# Altium footprint library ref-packages.PCBLIB: 1543 footprints (part 30 of 103)
Each footprint in its own frame and in the unit in brackets; x right, y up, seen from the top. Pads: shape width x height; smd on the part's side, far side on the other; paste and mask are expansions set on the pad; w line width, h text height; cw(c..) or ccw(c..) is an arc to the next point about the centre after c.
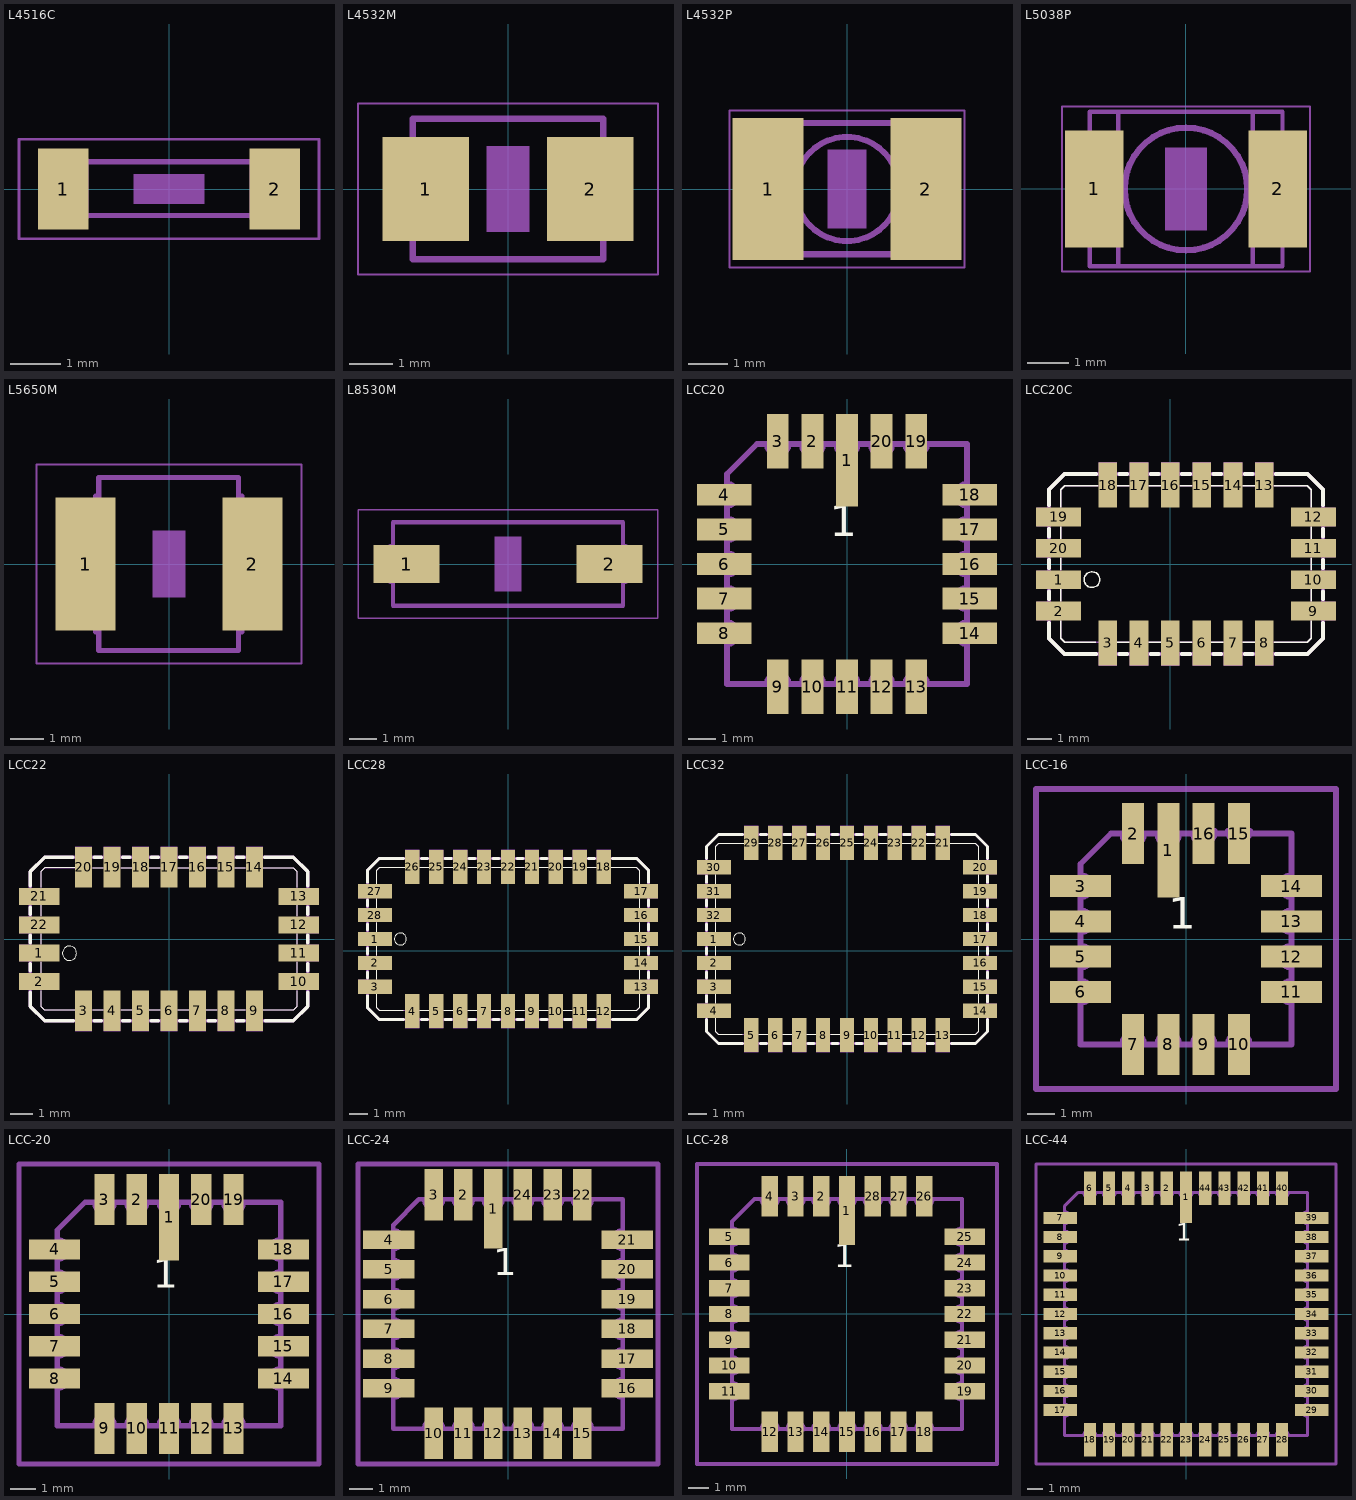
[diagram p29: the footprints below, top view; thin cyan lines are the x and y axes]

## L4516C [mm]
pads (2):
  rect 1x1.6 smd: 1(-2.1,0) 2(2.1,0)
Mechanical 6:
  rectangle: -0.7,-0.3 0.7,0.3
Mechanical 16:
  rectangle: -2.4,-0.597 -1.6,0.603
  rectangle: 1.6,-0.603 2.4,0.597
  lines w0.102: -1.626,-0.527 1.626,-0.527 ; -1.626,0.54 1.626,0.54
Mechanical 27:
  lines w0.051: -2.973,-0.983 2.973,-0.983 2.973,0.983 -2.973,0.983 -2.973,-0.983

## L4532M [mm]
pads (2):
  rect 2x2.4 smd: 1(-1.9,0) 2(1.9,0)
Mechanical 6:
  rectangle: -0.5,-1 0.5,1
Mechanical 16:
  lines w0.152: -2.337,-1.041 -2.337,1.041 ; 2.337,-1.041 2.337,1.041 ; -2.21,-1.626 2.21,-1.626 2.21,1.626 -2.21,1.626 -2.21,-1.626
Mechanical 27:
  lines w0.051: -3.473,-1.983 3.473,-1.983 3.473,1.983 -3.473,1.983 -3.473,-1.983

## L4532P [mm]
pads (2):
  rect 1.8x3.6 smd: 1(-2,0) 2(2,0)
Mechanical 6:
  rectangle: -0.5,-1 0.5,1
Mechanical 16:
  circle w0.152: c0,0 r1.321
  lines w0.152: -2.311,-1.653 2.311,-1.653 ; -2.311,-1.626 -2.311,1.626 ; -2.311,1.675 2.311,1.675 2.311,-1.626 ; -1.448,-1.626 -1.448,1.651 ; 1.448,-1.626 1.448,1.626
Mechanical 27:
  lines w0.051: -2.973,-1.983 2.973,-1.983 2.973,1.983 -2.973,1.983 -2.973,-1.983

## L5038P [mil]
pads (2):
  rect 55.12x110.24 smd: 1(-86.61,0) 2(86.61,0)
Mechanical 6:
  rectangle: -19.69,-39.37 19.69,39.37
Mechanical 16:
  circle w6: c0,0 r58
  lines w4: -93.94,-50 -93.94,50 ; -90.94,-72.99 -90.94,72.99 ; -90,-73.07 90.98,-73.07 ; -90,72.95 90.98,72.95 ; -63.94,-72.99 -63.94,72.99 ; 63.07,-72.99 63.07,72.99 ; 91.06,-72.99 91.06,72.99 ; 94.06,-50 94.06,50
Mechanical 27:
  lines w2: -117.05,-78.07 117.05,-78.07 117.05,78.07 -117.05,78.07 -117.05,-78.07

## L5650M [mm]
pads (2):
  rect 1.8x4 smd: 1(-2.5,0) 2(2.5,0)
Mechanical 6:
  rectangle: -0.5,-1 0.5,1
Mechanical 16:
  lines w0.152: -2.21,-2.032 -2.21,2.032 ; 2.184,-2.032 2.184,2.032 ; -2.108,-2.591 2.083,-2.591 2.083,2.591 -2.108,2.591 -2.108,-2.591
Mechanical 27:
  lines w0.051: -3.973,-2.983 3.973,-2.983 3.973,2.983 -3.973,2.983 -3.973,-2.983

## L8530M [mm]
pads (2):
  rect 2.4x1.4 smd: 1(-3.7,0) 2(3.7,0)
Mechanical 6:
  rectangle: -0.5,-1 0.5,1
Mechanical 16:
  lines w0.152: -4.293,-0.66 -4.293,0.66 ; 4.293,-0.66 4.293,0.66 ; -4.191,-1.524 -4.191,1.524 4.191,1.524 4.191,-1.524 -4.191,-1.524
Mechanical 27:
  lines w0.051: -5.473,-1.983 5.473,-1.983 5.473,1.983 -5.473,1.983 -5.473,-1.983

## LCC20 [mil]
pads (20):
  rect 31.5x133.86 smd: 1(0,149.61)
  rect 31.5x78.74 smd: 2(-50,177.17) 3(-100,177.17) 9(-100,-177.17) 10(-50,-177.17) 11(0,-177.17) 12(50,-177.17) 13(100,-177.17) 19(100,177.17) 20(50,177.17)
  rect 78.74x31.5 smd: 4(-177.17,100) 5(-177.17,50) 6(-177.17,0) 7(-177.17,-50) 8(-177.17,-100) 14(177.17,-100) 15(177.17,-50) 16(177.17,0) 17(177.17,50) 18(177.17,100)
Top Overlay:
  text "1" at -25,25 h77.5
Mechanical 16:
  lines w8: -173.23,-173.62 -173.23,-173.23 ; -173.23,-115.75 -173.23,-173.23 ; -173.23,-84.25 -173.23,-65.75 ; -173.23,-34.25 -173.23,-15.75 ; -173.23,15.75 -173.23,34.25 ; -173.23,65.75 -173.23,84.25 ; -173.23,115.75 -173.23,129.92 -129.92,173.23 -115.75,173.23 ; -173.17,-115.75 ccw(c-173.17,-100) -173.17,-84.25 ; -173.17,-65.75 ccw(c-173.17,-50) -173.17,-34.25 ; -173.17,-15.75 ccw(c-173.17,0) -173.17,15.75 ; -173.17,34.25 ccw(c-173.17,50) -173.17,65.75 ; -173.17,84.25 ccw(c-173.17,100) -173.17,115.75 ; -115.75,-173.23 -173.23,-173.23 ; -115.75,-173.17 cw(c-100,-173.17) -84.25,-173.17 ; -115.75,173.17 ccw(c-100,173.17) -84.25,173.17 ; -84.25,-173.23 -65.75,-173.23 ; -84.25,173.23 -65.75,173.23 ; -65.75,-173.17 cw(c-50,-173.17) -34.25,-173.17 ; -65.75,173.17 ccw(c-50,173.17) -34.25,173.17 ; -34.25,-173.23 -15.75,-173.23 ; -34.25,173.23 -15.75,173.23 ; -15.75,-173.17 cw(c0,-173.17) 15.75,-173.17 ; -15.75,173.17 ccw(c0,173.17) 15.75,173.17 ; 15.75,-173.23 34.25,-173.23 ; 15.75,173.23 34.25,173.23 ; 34.25,-173.17 cw(c50,-173.17) 65.75,-173.17 ; 34.25,173.17 ccw(c50,173.17) 65.75,173.17 ; 65.75,-173.23 84.25,-173.23 ; 65.75,173.23 84.25,173.23 ; 84.25,-173.17 cw(c100,-173.17) 115.75,-173.17 ; 84.25,173.17 ccw(c100,173.17) 115.75,173.17 ; 115.75,-173.23 173.23,-173.23 173.23,-115.75 ; 115.75,173.23 173.23,173.23 173.23,115.75 ; 173.17,-115.75 cw(c173.17,-100) 173.17,-84.25 ; 173.17,-65.75 cw(c173.17,-50) 173.17,-34.25 ; 173.17,-15.75 cw(c173.17,0) 173.17,15.75 ; 173.17,34.25 cw(c173.17,50) 173.17,65.75 ; 173.17,84.25 cw(c173.17,100) 173.17,115.75 ; 173.23,-84.25 173.23,-65.75 ; 173.23,-34.25 173.23,-15.75 ; 173.23,15.75 173.23,34.25 ; 173.23,65.75 173.23,84.25

## LCC20C [mil]
pads (20):
  rect 72.01x30 smd: 1(-178.35,-25) 2(-178.35,-75) 9(228.35,-75) 10(228.35,-25) 11(228.35,25) 12(228.35,75) 19(-178.35,75) 20(-178.35,25)
  rect 30x72.01 smd: 3(-100,-125.98) 4(-50,-125.98) 5(0,-125.98) 6(50,-125.98) 7(100,-125.98) 8(150,-125.98) 13(150,125.98) 14(100,125.98) 15(50,125.98) 16(0,125.98) 17(-50,125.98) 18(-100,125.98)
Top Overlay:
  circle w2: c-125,-25 r12.5
  lines w2: -175,-90.63 -175,-118.74 -168.74,-125 -118.74,-125 ; -175,-59.37 -175,-40.63 ; -175,-9.37 -175,9.37 ; -175,40.63 -175,59.37 ; -175,90.63 -175,118.74 -168.74,125 -115.63,125 ; -84.37,-125 -65.63,-125 ; -84.37,125 -65.63,125 ; -34.37,-125 -15.63,-125 ; -34.37,125 -15.63,125 ; 15.63,-125 34.37,-125 ; 15.63,125 34.37,125 ; 65.63,-125 84.37,-125 ; 65.63,125 84.37,125 ; 115.63,-125 134.37,-125 ; 115.63,125 134.37,125 ; 165.63,-125 218.74,-125 225,-118.74 225,-90.63 ; 165.63,125 218.74,125 225,118.74 225,90.63 ; 225,-59.37 225,-40.63 ; 225,-9.37 225,9.37 ; 225,40.63 225,59.37
  lines w6: -193.74,-93.74 -193.74,-118.74 -168.74,-143.74 -118.74,-143.74 ; -193.74,-56.26 -193.74,-43.74 ; -193.74,-6.26 -193.75,6.25 ; -193.75,43.75 -193.75,56.25 ; -193.75,93.75 -193.75,118.75 -168.75,143.75 -118.75,143.75 ; -81.26,-143.74 -68.74,-143.74 ; -81.25,143.75 -68.75,143.75 ; -31.26,-143.74 -18.74,-143.74 ; -31.25,143.75 -18.75,143.75 ; 18.75,-143.75 31.25,-143.75 ; 18.74,143.74 31.26,143.74 ; 68.75,-143.75 81.25,-143.75 ; 68.74,143.74 81.26,143.74 ; 118.75,-143.75 131.25,-143.75 ; 118.74,143.74 131.26,143.74 ; 168.75,-143.75 218.75,-143.75 243.75,-118.75 243.75,-93.75 ; 168.74,143.74 218.74,143.74 243.74,118.74 243.74,93.74 ; 243.75,-56.25 243.75,-43.75 ; 243.75,-6.25 243.74,6.26 ; 243.74,43.74 243.74,56.26
Mechanical 16:
  rectangle: -114.96,144.88 -85.04,162.6
  rectangle: -64.96,144.88 -35.04,162.6
  rectangle: -14.96,144.88 14.96,162.6
  rectangle: 35.04,144.88 64.96,162.6
  rectangle: 85.04,144.88 114.96,162.6
  rectangle: -114.96,-162.6 -85.04,-144.88
  rectangle: -64.96,-162.6 -35.04,-144.88
  rectangle: -14.96,-162.6 14.96,-144.88
  rectangle: 35.04,-162.6 64.96,-144.88
  rectangle: 85.04,-162.6 114.96,-144.88
  rectangle: 246.06,60.04 263.78,89.96
  rectangle: 246.06,10.04 263.78,39.96
  rectangle: 246.06,-39.96 263.78,-10.04
  rectangle: 246.06,-89.96 263.78,-60.04
  rectangle: -213.78,60.04 -196.06,89.96
  rectangle: -213.78,10.04 -196.06,39.96
  rectangle: -213.78,-39.96 -196.06,-10.04
  rectangle: -213.78,-89.96 -196.06,-60.04
  rectangle: 135.04,144.88 164.96,162.6
  rectangle: 135.04,-162.6 164.96,-144.88
  lines w2: -175,-118.74 -168.74,-125 218.74,-125 225,-118.74 225,118.74 218.74,125 -168.74,125 -175,118.74 -175,-118.74
  lines w6: 37.4,144.88 62.6,144.88 ; 87.4,144.88 112.6,144.88 ; 137.4,144.88 162.6,144.88 ; -193.74,-118.74 -168.74,-143.74 218.75,-143.75 243.75,-118.75 243.74,118.74 218.74,143.74 -168.75,143.75 -193.75,118.75 -193.74,-118.74

## LCC22 [mil]
pads (22):
  rect 70.87x29.92 smd: 1(-228.35,-25) 2(-228.35,-75) 10(228.35,-75) 11(228.35,-25) 12(228.35,25) 13(228.35,75) 21(-228.35,75) 22(-228.35,25)
  rect 29.92x70.87 smd: 3(-150,-125.98) 4(-100,-125.98) 5(-50,-125.98) 6(0,-125.98) 7(50,-125.98) 8(100,-125.98) 9(150,-125.98) 14(150,125.98) 15(100,125.98) 16(50,125.98) 17(0,125.98) 18(-50,125.98) 19(-100,125.98) 20(-150,125.98)
Top Overlay:
  circle w2: c-175,-25 r12.5
  lines w2: -225,-90.63 -225,-118.74 -218.74,-125 -165.63,-125 ; -225,-59.37 -225,-40.63 ; -225,-9.37 -225,9.37 ; -225,40.63 -225,59.37 ; -225,90.63 -225,118.74 -218.74,125 -165.63,125 ; -134.37,-125 -115.63,-125 ; -134.37,125 -115.63,125 ; -84.37,-125 -65.63,-125 ; -84.37,125 -65.63,125 ; -34.37,-125 -15.63,-125 ; -34.37,125 -15.63,125 ; 15.63,-125 34.37,-125 ; 15.63,125 34.37,125 ; 65.63,-125 84.37,-125 ; 65.63,125 84.37,125 ; 115.63,-125 134.37,-125 ; 115.63,125 134.37,125 ; 165.63,-125 218.74,-125 225,-118.74 225,-90.63 ; 165.63,125 218.74,125 225,118.74 225,90.63 ; 225,-59.37 225,-40.63 ; 225,-9.37 225,9.37 ; 225,40.63 225,59.37
  lines w6: -243.74,-93.74 -243.74,-118.74 -218.74,-143.74 -168.74,-143.74 ; -243.74,-56.26 -243.74,-43.74 ; -243.74,-6.26 -243.75,6.25 ; -243.75,43.75 -243.75,56.25 ; -243.75,93.75 -243.75,118.75 -218.75,143.75 -168.75,143.75 ; -131.26,-143.74 -118.74,-143.74 ; -131.25,143.75 -118.75,143.75 ; -81.26,-143.74 -68.74,-143.74 ; -81.25,143.75 -68.75,143.75 ; -31.26,-143.74 -18.74,-143.74 ; -31.25,143.75 -18.75,143.75 ; 18.75,-143.75 31.25,-143.75 ; 18.74,143.74 31.26,143.74 ; 68.75,-143.75 81.25,-143.75 ; 68.74,143.74 81.26,143.74 ; 118.75,-143.75 131.25,-143.75 ; 118.74,143.74 131.26,143.74 ; 168.75,-143.75 218.75,-143.75 243.75,-118.75 243.75,-93.75 ; 168.74,143.74 218.74,143.74 243.74,118.74 243.74,93.74 ; 243.75,-56.25 243.75,-43.75 ; 243.75,-6.25 243.74,6.26 ; 243.74,43.74 243.74,56.26
Mechanical 16:
  rectangle: -114.96,144.88 -85.04,162.6
  rectangle: -64.96,144.88 -35.04,162.6
  rectangle: -14.96,144.88 14.96,162.6
  rectangle: 35.04,144.88 64.96,162.6
  rectangle: 85.04,144.88 114.96,162.6
  rectangle: -114.96,-162.6 -85.04,-144.88
  rectangle: -64.96,-162.6 -35.04,-144.88
  rectangle: -14.96,-162.6 14.96,-144.88
  rectangle: 35.04,-162.6 64.96,-144.88
  rectangle: 85.04,-162.6 114.96,-144.88
  rectangle: 246.06,60.04 263.78,89.96
  rectangle: 246.06,10.04 263.78,39.96
  rectangle: 246.06,-39.96 263.78,-10.04
  rectangle: 246.06,-89.96 263.78,-60.04
  rectangle: -263.78,60.04 -246.06,89.96
  rectangle: -263.78,10.04 -246.06,39.96
  rectangle: -263.78,-39.96 -246.06,-10.04
  rectangle: -263.78,-89.96 -246.06,-60.04
  rectangle: 135.04,144.88 164.96,162.6
  rectangle: 135.04,-162.6 164.96,-144.88
  rectangle: -164.96,144.88 -135.04,162.6
  rectangle: -164.96,-162.6 -135.04,-144.88
  lines w2: -225,-118.74 -218.74,-125 218.74,-125 225,-118.74 225,118.74 218.74,125 -218.74,125 -225,118.74 -225,-118.74
  lines w6: 37.4,144.88 62.6,144.88 ; 87.4,144.88 112.6,144.88 ; 137.4,144.88 162.6,144.88 ; -243.74,-118.74 -218.74,-143.74 218.75,-143.75 243.75,-118.75 243.74,118.74 218.74,143.74 -218.75,143.75 -243.75,118.75 -243.74,-118.74

## LCC28 [mil]
pads (28):
  rect 70.87x29.92 smd: 1(-278.35,25) 2(-278.35,-25) 3(-278.35,-75) 13(278.35,-75) 14(278.35,-25) 15(278.35,25) 16(278.35,75) 17(278.35,125) 27(-278.35,125) 28(-278.35,75)
  rect 29.92x70.87 smd: 4(-200,-125.98) 5(-150,-125.98) 6(-100,-125.98) 7(-50,-125.98) 8(0,-125.98) 9(50,-125.98) 10(100,-125.98) 11(150,-125.98) 12(200,-125.98) 18(200,175.98) 19(150,175.98) 20(100,175.98) 21(50,175.98) 22(0,175.98) 23(-50,175.98) 24(-100,175.98) 25(-150,175.98) 26(-200,175.98)
Top Overlay:
  circle w2: c-225,25 r12.5
  lines w2: -275,-90.63 -275,-118.74 -268.74,-125 -218.74,-125 ; -275,-59.37 -275,-40.63 ; -275,-9.37 -275,9.37 ; -275,40.63 -275,59.37 ; -275,90.63 -275,109.37 ; -275,140.63 -275,168.74 -268.74,175 -215.63,175 ; -184.37,-125 -165.63,-125 ; -184.37,175 -165.63,175 ; -134.37,-125 -115.63,-125 ; -134.37,175 -115.63,175 ; -84.37,-125 -65.63,-125 ; -84.37,175 -65.63,175 ; -34.37,-125 -15.63,-125 ; -34.37,175 -15.63,175 ; 15.63,-125 34.37,-125 ; 15.63,175 34.37,175 ; 65.63,-125 84.37,-125 ; 65.63,175 84.37,175 ; 115.63,-125 134.37,-125 ; 115.63,175 134.37,175 ; 165.63,-125 184.37,-125 ; 165.63,175 184.37,175 ; 215.63,-125 268.74,-125 275,-118.74 275,-90.63 ; 215.63,175 268.74,175 275,168.74 275,140.63 ; 275,-59.37 275,-40.63 ; 275,-9.37 275,9.37 ; 275,40.63 275,59.37 ; 275,90.63 275,109.37
  lines w6: -293.74,-93.74 -293.74,-118.74 -268.74,-143.74 -218.74,-143.74 ; -293.74,-56.26 -293.74,-43.74 ; -293.74,-6.26 -293.75,6.25 ; -293.74,43.74 -293.75,56.25 ; -293.74,93.74 -293.75,106.25 ; -293.75,143.75 -293.75,168.75 -268.75,193.75 -218.75,193.75 ; -181.26,-143.74 -168.74,-143.74 ; -181.25,193.75 -168.75,193.75 ; -131.26,-143.74 -118.74,-143.74 ; -131.25,193.75 -118.75,193.75 ; -81.26,-143.74 -68.74,-143.74 ; -81.25,193.75 -68.75,193.75 ; -31.26,-143.74 -18.74,-143.74 ; -31.25,193.75 -18.75,193.75 ; 18.75,-143.75 31.25,-143.75 ; 18.74,193.74 31.26,193.74 ; 68.75,-143.75 81.25,-143.75 ; 68.74,193.74 81.26,193.74 ; 118.75,-143.75 131.25,-143.75 ; 118.74,193.74 131.26,193.74 ; 168.75,-143.75 181.25,-143.75 ; 168.74,193.74 181.26,193.74 ; 218.75,-143.75 268.75,-143.75 293.75,-118.75 293.75,-93.75 ; 218.74,193.74 268.74,193.74 293.74,168.74 293.74,143.74 ; 293.75,-56.25 293.75,-43.75 ; 293.75,-6.25 293.74,6.26 ; 293.75,43.75 293.74,56.26 ; 293.75,93.75 293.74,106.26
Mechanical 16:
  rectangle: -114.96,194.88 -85.04,212.6
  rectangle: -64.96,194.88 -35.04,212.6
  rectangle: -14.96,194.88 14.96,212.6
  rectangle: 35.04,194.88 64.96,212.6
  rectangle: 85.04,194.88 114.96,212.6
  rectangle: -114.96,-162.6 -85.04,-144.88
  rectangle: -64.96,-162.6 -35.04,-144.88
  rectangle: -14.96,-162.6 14.96,-144.88
  rectangle: 35.04,-162.6 64.96,-144.88
  rectangle: 85.04,-162.6 114.96,-144.88
  rectangle: 296.06,110.04 313.78,139.96
  rectangle: 296.06,10.04 313.78,39.96
  rectangle: 296.06,-39.96 313.78,-10.04
  rectangle: 296.06,-89.96 313.78,-60.04
  rectangle: -313.78,110.04 -296.06,139.96
  rectangle: -313.78,10.04 -296.06,39.96
  rectangle: -313.78,-39.96 -296.06,-10.04
  rectangle: -313.78,-89.96 -296.06,-60.04
  rectangle: 135.04,194.88 164.96,212.6
  rectangle: 135.04,-162.6 164.96,-144.88
  rectangle: -214.96,194.88 -185.04,212.6
  rectangle: -164.96,194.88 -135.04,212.6
  rectangle: -214.96,-162.6 -185.04,-144.88
  rectangle: -164.96,-162.6 -135.04,-144.88
  rectangle: 296.06,60.04 313.78,89.96
  rectangle: -313.78,60.04 -296.06,89.96
  rectangle: 185.04,194.88 214.96,212.6
  rectangle: 185.04,-162.6 214.96,-144.88
  lines w2: -275,-118.74 -268.74,-125 268.74,-125 275,-118.74 275,168.74 268.74,175 -268.74,175 -275,168.74 -275,-118.74
  lines w6: 37.4,194.88 62.6,194.88 ; 87.4,194.88 112.6,194.88 ; 137.4,194.88 162.6,194.88 ; 187.4,194.88 212.6,194.88 ; -293.74,-118.74 -268.74,-143.74 268.75,-143.75 293.75,-118.75 293.74,168.74 268.74,193.74 -268.75,193.75 -293.75,168.75 -293.74,-118.74

## LCC32 [mil]
pads (32):
  rect 70.87x29.92 smd: 1(-278.35,25) 2(-278.35,-25) 3(-278.35,-75) 4(-278.35,-125) 14(278.35,-125) 15(278.35,-75) 16(278.35,-25) 17(278.35,25) 18(278.35,75) 19(278.35,125) 20(278.35,175) 30(-278.35,175) 31(-278.35,125) 32(-278.35,75)
  rect 29.92x70.87 smd: 5(-200,-175.98) 6(-150,-175.98) 7(-100,-175.98) 8(-50,-175.98) 9(0,-175.98) 10(50,-175.98) 11(100,-175.98) 12(150,-175.98) 13(200,-175.98) 21(200,225.98) 22(150,225.98) 23(100,225.98) 24(50,225.98) 25(0,225.98) 26(-50,225.98) 27(-100,225.98) 28(-150,225.98) 29(-200,225.98)
Top Overlay:
  circle w2: c-225,25 r12.5
  lines w2: -275,-140.63 -275,-168.74 -268.74,-175 -218.74,-175 ; -275,-109.37 -275,-90.63 ; -275,-59.37 -275,-40.63 ; -275,-9.37 -275,9.37 ; -275,40.63 -275,59.37 ; -275,90.63 -275,109.37 ; -275,140.63 -275,159.37 ; -275,190.63 -275,218.74 -268.74,225 -215.63,225 ; -184.37,-175 -165.63,-175 ; -184.37,225 -165.63,225 ; -134.37,-175 -115.63,-175 ; -134.37,225 -115.63,225 ; -84.37,-175 -65.63,-175 ; -84.37,225 -65.63,225 ; -34.37,-175 -15.63,-175 ; -34.37,225 -15.63,225 ; 15.63,-175 34.37,-175 ; 15.63,225 34.37,225 ; 65.63,-175 84.37,-175 ; 65.63,225 84.37,225 ; 115.63,-175 134.37,-175 ; 115.63,225 134.37,225 ; 165.63,-175 184.37,-175 ; 165.63,225 184.37,225 ; 215.63,-175 268.74,-175 275,-168.74 275,-140.63 ; 215.63,225 268.74,225 275,218.74 275,190.63 ; 275,-109.37 275,-90.63 ; 275,-59.37 275,-40.63 ; 275,-9.37 275,9.37 ; 275,40.63 275,59.37 ; 275,90.63 275,109.37 ; 275,140.63 275,159.37
  lines w6: -293.74,-143.74 -293.74,-168.74 -268.74,-193.74 -218.74,-193.74 ; -293.74,-106.26 -293.74,-93.74 ; -293.74,-56.26 -293.74,-43.74 ; -293.74,-6.26 -293.75,6.25 ; -293.74,43.74 -293.75,56.25 ; -293.74,93.74 -293.75,106.25 ; -293.74,143.74 -293.75,156.25 ; -293.75,193.75 -293.75,218.75 -268.75,243.75 -218.75,243.75 ; -181.26,-193.74 -168.74,-193.74 ; -181.25,243.75 -168.75,243.75 ; -131.26,-193.74 -118.74,-193.74 ; -131.25,243.75 -118.75,243.75 ; -81.26,-193.74 -68.74,-193.74 ; -81.25,243.75 -68.75,243.75 ; -31.26,-193.74 -18.74,-193.74 ; -31.25,243.75 -18.75,243.75 ; 18.75,-193.75 31.25,-193.75 ; 18.74,243.74 31.26,243.74 ; 68.75,-193.75 81.25,-193.75 ; 68.74,243.74 81.26,243.74 ; 118.75,-193.75 131.25,-193.75 ; 118.74,243.74 131.26,243.74 ; 168.75,-193.75 181.25,-193.75 ; 168.74,243.74 181.26,243.74 ; 218.75,-193.75 268.75,-193.75 293.75,-168.75 293.75,-143.75 ; 218.74,243.74 268.74,243.74 293.74,218.74 293.74,193.74 ; 293.75,-106.25 293.75,-93.75 ; 293.75,-56.25 293.75,-43.75 ; 293.75,-6.25 293.74,6.26 ; 293.75,43.75 293.74,56.26 ; 293.75,93.75 293.74,106.26 ; 293.75,143.75 293.74,156.26
Mechanical 16:
  rectangle: -114.96,244.88 -85.04,262.6
  rectangle: -64.96,244.88 -35.04,262.6
  rectangle: -14.96,244.88 14.96,262.6
  rectangle: 35.04,244.88 64.96,262.6
  rectangle: 85.04,244.88 114.96,262.6
  rectangle: -114.96,-212.6 -85.04,-194.88
  rectangle: -64.96,-212.6 -35.04,-194.88
  rectangle: -14.96,-212.6 14.96,-194.88
  rectangle: 35.04,-212.6 64.96,-194.88
  rectangle: 85.04,-212.6 114.96,-194.88
  rectangle: 296.06,110.04 313.78,139.96
  rectangle: 296.06,10.04 313.78,39.96
  rectangle: 296.06,-39.96 313.78,-10.04
  rectangle: 296.06,-89.96 313.78,-60.04
  rectangle: -313.78,110.04 -296.06,139.96
  rectangle: -313.78,10.04 -296.06,39.96
  rectangle: -313.78,-39.96 -296.06,-10.04
  rectangle: -313.78,-89.96 -296.06,-60.04
  rectangle: 135.04,244.88 164.96,262.6
  rectangle: 135.04,-212.6 164.96,-194.88
  rectangle: -214.96,244.88 -185.04,262.6
  rectangle: -164.96,244.88 -135.04,262.6
  rectangle: -214.96,-212.6 -185.04,-194.88
  rectangle: -164.96,-212.6 -135.04,-194.88
  rectangle: 296.06,60.04 313.78,89.96
  rectangle: -313.78,60.04 -296.06,89.96
  rectangle: 185.04,244.88 214.96,262.6
  rectangle: 185.04,-212.6 214.96,-194.88
  rectangle: 296.06,160.04 313.78,189.96
  rectangle: -313.78,160.04 -296.06,189.96
  rectangle: 296.06,-139.96 313.78,-110.04
  rectangle: -313.78,-139.96 -296.06,-110.04
  lines w2: -275,-168.74 -268.74,-175 268.74,-175 275,-168.74 275,218.74 268.74,225 -268.74,225 -275,218.74 -275,-168.74
  lines w6: 37.4,244.88 62.6,244.88 ; 87.4,244.88 112.6,244.88 ; 137.4,244.88 162.6,244.88 ; 187.4,244.88 212.6,244.88 ; -293.74,-168.74 -268.74,-193.74 268.75,-193.75 293.75,-168.75 293.74,218.74 268.74,243.74 -268.75,243.75 -293.75,218.75 -293.74,-168.74

## LCC-16 [mil]
pads (16):
  rect 31.5x133.86 smd: 1(-25,125.98)
  rect 31.5x86.61 smd: 2(-75,149.61) 7(-75,-149.61) 8(-25,-149.61) 9(25,-149.61) 10(75,-149.61) 15(75,149.61) 16(25,149.61)
  rect 86.61x31.5 smd: 3(-149.61,75) 4(-149.61,25) 5(-149.61,-25) 6(-149.61,-75) 11(149.61,-75) 12(149.61,-25) 13(149.61,25) 14(149.61,75)
Top Overlay:
  text "1" at -25,0 h77.5
Mechanical 16:
  lines w8: -149.61,-150 -149.61,-149.61 ; 40.75,149.61 59.25,149.61 ; 40.75,153.54 cw(c25,151.57) 9.25,149.6 -9.25,149.61 cw(c-25,149.6) -40.75,149.6 -59.25,149.61 cw(c-75,149.6) -90.75,149.6 -106.3,149.61 -149.61,106.3 -149.61,90.75 cw(c-149.6,75) -149.6,59.25 -149.61,40.75 cw(c-149.6,25) -149.6,9.25 -149.61,-9.25 cw(c-149.6,-25) -149.6,-40.75 -149.61,-59.25 cw(c-149.6,-75) -149.6,-90.75 -149.61,-149.61 ; 59.25,153.54 ccw(c75,153.54) 90.75,153.54 ; 90.75,149.61 149.61,149.61 149.61,90.75 ccw(c149.6,75) 149.6,59.25 149.61,40.75 ccw(c149.6,25) 149.6,9.25 149.61,-9.25 ccw(c149.6,-25) 149.6,-40.75 149.61,-59.25 ccw(c149.6,-75) 149.6,-90.75 149.61,-149.61 90.75,-149.61 ccw(c75,-149.6) 59.25,-149.6 40.75,-149.61 ccw(c25,-149.6) 9.25,-149.6 -9.25,-149.61 ccw(c-25,-149.6) -40.75,-149.6 -59.25,-149.61 ccw(c-75,-149.6) -90.75,-149.6 -149.61,-149.61
Mechanical 27:
  lines w7.87: -212.72,-212.72 212.72,-212.72 212.72,212.72 -212.72,212.72 -212.72,-212.72

## LCC-20 [mil]
pads (20):
  rect 31.5x133.86 smd: 1(0,149.61)
  rect 31.5x78.74 smd: 2(-50,177.17) 3(-100,177.17) 9(-100,-177.17) 10(-50,-177.17) 11(0,-177.17) 12(50,-177.17) 13(100,-177.17) 19(100,177.17) 20(50,177.17)
  rect 78.74x31.5 smd: 4(-177.17,100) 5(-177.17,50) 6(-177.17,0) 7(-177.17,-50) 8(-177.17,-100) 14(177.17,-100) 15(177.17,-50) 16(177.17,0) 17(177.17,50) 18(177.17,100)
Top Overlay:
  text "1" at -25,25 h77.5
Mechanical 16:
  lines w8: -173.23,-173.62 -173.23,-173.23 ; -173.23,-173.23 -173.23,-115.75 ccw(c-173.23,-100) -173.23,-84.25 -173.23,-65.75 ccw(c-173.23,-50) -173.23,-34.25 -173.23,-15.75 ccw(c-173.23,0) -173.23,15.75 -173.23,34.25 ccw(c-173.23,50) -173.23,65.75 -173.23,84.25 ccw(c-173.23,100) -173.23,115.75 -173.23,129.92 -129.92,173.23 -115.75,173.23 ccw(c-100,173.23) -84.25,173.23 -65.75,173.23 ccw(c-50,173.23) -34.25,173.23 -15.75,173.23 ccw(c0,173.23) 15.75,173.23 34.25,173.23 ccw(c50,173.23) 65.75,173.23 84.25,173.23 ccw(c100,173.23) 115.75,173.23 173.23,173.23 173.23,115.75 ccw(c173.23,100) 173.23,84.25 173.23,65.75 ccw(c173.23,50) 173.23,34.25 173.23,15.75 ccw(c173.23,0) 173.23,-15.75 173.23,-34.25 ccw(c173.23,-50) 173.23,-65.75 173.23,-84.25 ccw(c173.23,-100) 173.23,-115.75 173.23,-173.23 115.75,-173.23 ccw(c100,-173.23) 84.25,-173.23 65.75,-173.23 ccw(c50,-173.23) 34.25,-173.23 15.75,-173.23 ccw(c0,-173.23) -15.75,-173.23 -34.25,-173.23 ccw(c-50,-173.23) -65.75,-173.23 -84.25,-173.23 ccw(c-100,-173.23) -115.75,-173.23 -173.23,-173.23
Mechanical 27:
  lines w7.87: -232.4,-232.4 232.4,-232.4 232.4,232.4 -232.4,232.4 -232.4,-232.4

## LCC-24 [mil]
pads (24):
  rect 31.5x133.86 smd: 1(-25,177.17)
  rect 31.5x86.61 smd: 2(-75,200.79) 3(-125,200.79) 10(-125,-200.79) 11(-75,-200.79) 12(-25,-200.79) 13(25,-200.79) 14(75,-200.79) 15(125,-200.79) 22(125,200.79) 23(75,200.79) 24(25,200.79)
  rect 86.61x31.5 smd: 4(-200.79,125) 5(-200.79,75) 6(-200.79,25) 7(-200.79,-25) 8(-200.79,-75) 9(-200.79,-125) 16(200.79,-125) 17(200.79,-75) 18(200.79,-25) 19(200.79,25) 20(200.79,75) 21(200.79,125)
Top Overlay:
  text "1" at -25,50 h77.5
Mechanical 16:
  lines w8: -192.91,-192.91 -192.91,-140.75 ccw(c-192.91,-125) -192.91,-109.25 -192.91,-90.75 ccw(c-192.91,-75) -192.91,-59.25 -192.91,-40.75 ccw(c-192.91,-25) -192.91,-9.25 -192.91,9.25 ccw(c-192.91,25) -192.91,40.75 -192.91,59.25 ccw(c-192.91,75) -192.91,90.75 -192.91,109.25 ccw(c-192.91,125) -192.91,140.75 -192.91,149.41 -149.61,192.72 -140.75,192.72 ccw(c-125,192.71) -109.25,192.71 -90.75,192.72 ccw(c-75,192.71) -59.25,192.71 -40.75,192.72 ccw(c-25,192.71) -9.25,192.71 9.25,192.72 ccw(c25,192.71) 40.75,192.71 59.25,192.72 ccw(c75,192.71) 90.75,192.71 109.25,192.72 ccw(c125,192.71) 140.75,192.71 192.91,192.72 192.91,140.75 ccw(c192.91,125) 192.91,109.25 192.91,90.75 ccw(c192.91,75) 192.91,59.25 192.91,40.75 ccw(c192.91,25) 192.91,9.25 192.91,-9.25 ccw(c192.91,-25) 192.91,-40.75 192.91,-59.25 ccw(c192.91,-75) 192.91,-90.75 192.91,-109.25 ccw(c192.91,-125) 192.91,-140.75 192.91,-192.91 140.75,-192.91 ccw(c125,-192.91) 109.25,-192.91 90.75,-192.91 ccw(c75,-192.91) 59.25,-192.91 40.75,-192.91 ccw(c25,-192.91) 9.25,-192.91 -9.25,-192.91 ccw(c-25,-192.91) -40.75,-192.91 -59.25,-192.91 ccw(c-75,-192.91) -90.75,-192.91 -109.25,-192.91 ccw(c-125,-192.91) -140.75,-192.91 -192.91,-192.91
Mechanical 27:
  lines w7.87: -252.09,-252.09 252.09,-252.09 252.09,252.09 -252.09,252.09 -252.09,-252.09

## LCC-28 [mil]
pads (28):
  rect 31.5x133.86 smd: 1(0,200.79)
  rect 31.5x78.74 smd: 2(-50,228.35) 3(-100,228.35) 4(-150,228.35) 12(-150,-228.35) 13(-100,-228.35) 14(-50,-228.35) 15(0,-228.35) 16(50,-228.35) 17(100,-228.35) 18(150,-228.35) 26(150,228.35) 27(100,228.35) 28(50,228.35)
  rect 78.74x31.5 smd: 5(-228.35,150) 6(-228.35,100) 7(-228.35,50) 8(-228.35,0) 9(-228.35,-50) 10(-228.35,-100) 11(-228.35,-150) 19(228.35,-150) 20(228.35,-100) 21(228.35,-50) 22(228.35,0) 23(228.35,50) 24(228.35,100) 25(228.35,150)
Top Overlay:
  text "1" at -25,75 h77.5
Mechanical 16:
  lines w8: -165.75,-224.22 cw(c-150,-224.22) -134.25,-224.22 ; -165.75,-223.23 -223.23,-223.23 -223.23,-165.75 ccw(c-223.23,-150) -223.23,-134.25 -223.23,-115.75 ccw(c-223.23,-100) -223.23,-84.25 -223.23,-65.75 ccw(c-223.23,-50) -223.23,-34.25 -223.23,-15.75 ccw(c-223.23,0) -223.23,15.75 -223.23,34.25 ccw(c-223.23,50) -223.23,65.75 -223.23,84.25 ccw(c-223.23,100) -223.23,115.75 -223.23,134.25 ccw(c-223.23,150) -223.23,165.75 -223.23,179.92 -179.92,223.23 -165.75,223.23 ccw(c-150,223.23) -134.25,223.23 -115.75,223.23 ccw(c-100,223.23) -84.25,223.23 -65.75,223.23 ccw(c-50,223.23) -34.25,223.23 -15.75,223.23 ccw(c0,223.23) 15.75,223.23 34.25,223.23 ccw(c50,223.23) 65.75,223.23 84.25,223.23 ccw(c100,223.23) 115.75,223.23 134.25,223.23 ccw(c150,223.23) 165.75,223.23 223.23,223.23 223.23,165.75 ccw(c223.23,150) 223.23,134.25 223.23,115.75 ccw(c223.23,100) 223.23,84.25 223.23,65.75 ccw(c223.23,50) 223.23,34.25 223.23,15.75 ccw(c223.23,0) 223.23,-15.75 223.23,-34.25 ccw(c223.23,-50) 223.23,-65.75 223.23,-84.25 ccw(c223.23,-100) 223.23,-115.75 223.23,-134.25 ccw(c223.23,-150) 223.23,-165.75 223.23,-223.23 165.75,-223.23 ; -134.25,-223.23 -115.75,-223.23 ; -115.75,-224.22 cw(c-100,-224.22) -84.25,-224.22 ; -84.25,-223.23 -65.75,-223.23 ; -65.75,-224.22 cw(c-50,-224.22) -34.25,-224.22 ; -34.25,-223.23 -15.75,-223.23 ; -15.75,-224.22 cw(c0,-224.22) 15.75,-224.22 ; 15.75,-223.23 34.25,-223.23 ; 34.25,-224.22 cw(c50,-224.22) 65.75,-224.22 ; 65.75,-223.23 84.25,-223.23 ; 84.25,-224.22 cw(c100,-224.22) 115.75,-224.22 ; 115.75,-223.23 134.25,-223.23 ; 134.25,-224.22 cw(c150,-224.22) 165.75,-224.22
Mechanical 27:
  lines w7.87: -291.46,-291.46 291.46,-291.46 291.46,291.46 -291.46,291.46 -291.46,-291.46

## LCC-44 [mil]
pads (44):
  rect 31.5x133.86 smd: 1(0,303.15)
  rect 31.5x86.61 smd: 2(-50,326.77) 3(-100,326.77) 4(-150,326.77) 5(-200,326.77) 6(-250,326.77) 18(-250,-326.77) 19(-200,-326.77) 20(-150,-326.77) 21(-100,-326.77) 22(-50,-326.77) 23(0,-326.77) 24(50,-326.77) 25(100,-326.77) 26(150,-326.77) 27(200,-326.77) 28(250,-326.77) 40(250,326.77) 41(200,326.77) 42(150,326.77) 43(100,326.77) 44(50,326.77)
  rect 86.61x31.5 smd: 7(-326.77,250) 8(-326.77,200) 9(-326.77,150) 10(-326.77,100) 11(-326.77,50) 12(-326.77,0) 13(-326.77,-50) 14(-326.77,-100) 15(-326.77,-150) 16(-326.77,-200) 17(-326.77,-250) 29(326.77,-250) 30(326.77,-200) 31(326.77,-150) 32(326.77,-100) 33(326.77,-50) 34(326.77,0) 35(326.77,50) 36(326.77,100) 37(326.77,150) 38(326.77,200) 39(326.77,250)
Top Overlay:
  text "1" at -25,175 h77.5
Mechanical 16:
  lines w8: -316.14,-316.14 -316.14,-265.75 ccw(c-316.14,-250) -316.14,-234.25 -316.14,-215.75 ccw(c-316.14,-200) -316.14,-184.25 -316.14,-165.75 ccw(c-316.14,-150) -316.14,-134.25 -316.14,-115.75 ccw(c-316.14,-100) -316.14,-84.25 -316.14,-65.75 ccw(c-316.14,-50) -316.14,-34.25 -316.14,-15.75 ccw(c-316.14,0) -316.14,15.75 -316.14,34.25 ccw(c-316.14,50) -316.14,65.75 -316.14,84.25 ccw(c-316.14,100) -316.14,115.75 -316.14,134.25 ccw(c-316.14,150) -316.14,165.75 -316.14,184.25 ccw(c-316.14,200) -316.14,215.75 -316.14,234.25 ccw(c-316.14,250) -316.14,265.75 -316.14,279.92 -279.92,316.14 -265.75,316.14 ccw(c-250,316.14) -234.25,316.14 -215.75,316.14 ccw(c-200,316.14) -184.25,316.14 -165.75,316.14 ccw(c-150,316.14) -134.25,316.14 -115.75,316.14 ccw(c-100,316.14) -84.25,316.14 -65.75,316.14 ccw(c-50,316.14) -34.25,316.14 -15.75,316.14 ccw(c0,316.14) 15.75,316.14 34.25,316.14 ccw(c50,316.14) 65.75,316.14 84.25,316.14 ccw(c100,316.14) 115.75,316.14 134.25,316.14 ccw(c150,316.14) 165.75,316.14 184.25,316.14 ccw(c200,316.14) 215.75,316.14 234.25,316.14 ccw(c250,316.14) 265.75,316.14 316.14,316.14 316.14,265.75 ccw(c316.14,250) 316.14,234.25 316.14,215.75 ccw(c316.14,200) 316.14,184.25 316.14,165.75 ccw(c316.14,150) 316.14,134.25 316.14,115.75 ccw(c316.14,100) 316.14,84.25 316.14,65.75 ccw(c316.14,50) 316.14,34.25 316.14,15.75 ccw(c316.14,0) 316.14,-15.75 316.14,-34.25 ccw(c316.14,-50) 316.14,-65.75 316.14,-84.25 ccw(c316.14,-100) 316.14,-115.75 316.14,-134.25 ccw(c316.14,-150) 316.14,-165.75 316.14,-184.25 ccw(c316.14,-200) 316.14,-215.75 316.14,-234.25 ccw(c316.14,-250) 316.14,-265.75 316.14,-316.14 265.75,-316.14 ccw(c250,-316.14) 234.25,-316.14 215.75,-316.14 ccw(c200,-316.14) 184.25,-316.14 165.75,-316.14 ccw(c150,-316.14) 134.25,-316.14 115.75,-316.14 ccw(c100,-316.14) 84.25,-316.14 65.75,-316.14 ccw(c50,-316.14) 34.25,-316.14 15.75,-316.14 ccw(c0,-316.14) -15.75,-316.14 -34.25,-316.14 ccw(c-50,-316.14) -65.75,-316.14 -84.25,-316.14 ccw(c-100,-316.14) -115.75,-316.14 -134.25,-316.14 ccw(c-150,-316.14) -165.75,-316.14 -184.25,-316.14 ccw(c-200,-316.14) -215.75,-316.14 -234.25,-316.14 ccw(c-250,-316.14) -265.75,-316.14 -316.14,-316.14
Mechanical 27:
  lines w7.87: -389.88,-389.88 389.88,-389.88 389.88,389.88 -389.88,389.88 -389.88,-389.88